# Altium footprint library LimeMicroAltiumLib_pcbLib_r01.PcbLib: 434 footprints (part 12 of 29)
Each footprint in its own frame and in the unit in brackets; x right, y up, seen from the top. Pads: shape width x height; smd on the part's side, far side on the other; paste and mask are expansions set on the pad; w line width, h text height; cw(c..) or ccw(c..) is an arc to the next point about the centre after c.
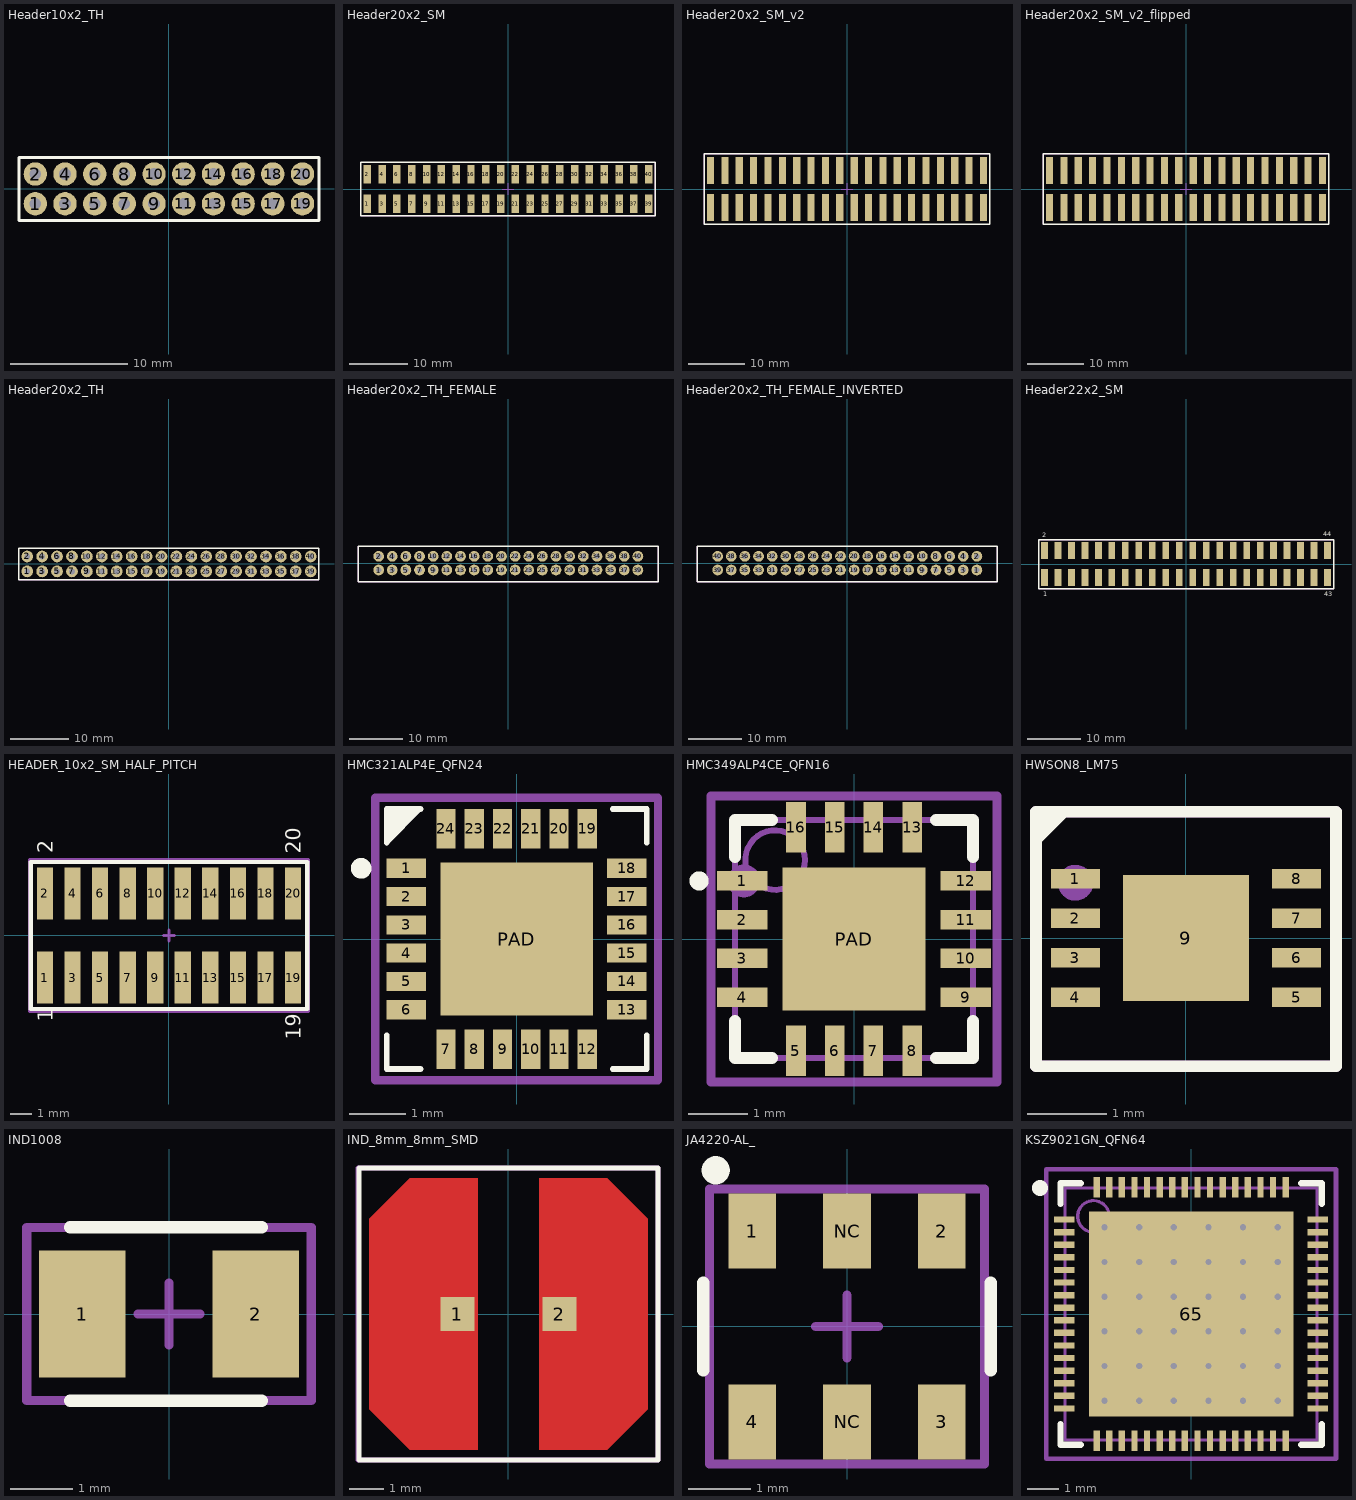
[diagram p11: the footprints below, top view; thin cyan lines are the x and y axes]

## Header10x2_TH [mm] "JTAG"
pads (20):
  round 2 hole 1: 1(-11.443,-1.271) 2(-11.443,1.271) 3(-8.9,-1.271) 4(-8.9,1.271) 5(-6.357,-1.271) 6(-6.357,1.271) 7(-3.814,-1.271) 8(-3.814,1.271) 9(-1.271,-1.271) 10(-1.271,1.271) 11(1.271,-1.271) 12(1.271,1.271) 13(3.814,-1.271) 14(3.814,1.271) 15(6.357,-1.271) 16(6.357,1.271) 17(8.9,-1.271) 18(8.9,1.271) 19(11.443,-1.271) 20(11.443,1.271)
Top Overlay:
  lines w0.254: -12.843,-2.7 12.857,-2.7 12.857,2.675 -12.843,2.675 -12.843,-2.7
Mechanical 15:
  lines w0.15: -12.843,-2.7 -12.843,2.675 12.857,2.675 12.857,-2.7 -12.843,-2.7
  text ".Designator" at -0.543,-0.021 h0.55
3D body "65775.stp": height 8.54, standoff -3, extent -12.713,0.002 -10.173,2.542
3D body "65775.stp": height 8.54, standoff -3, extent -12.713,-2.541 -10.173,-0.001
3D body "65775.stp": height 8.54, standoff -3, extent -10.17,-2.541 -7.63,-0.001
3D body "65775.stp": height 8.54, standoff -3, extent -10.17,0.002 -7.63,2.542
3D body "65775.stp": height 8.54, standoff -3, extent -7.627,-2.541 -5.087,-0.001
3D body "65775.stp": height 8.54, standoff -3, extent -7.627,0.002 -5.087,2.542
3D body "65775.stp": height 8.54, standoff -3, extent 0.001,0.002 2.541,2.542
3D body "65775.stp": height 8.54, standoff -3, extent 0.001,-2.541 2.541,-0.001
3D body "65775.stp": height 8.54, standoff -3, extent -2.541,0.002 -0.001,2.542
3D body "65775.stp": height 8.54, standoff -3, extent -2.541,-2.541 -0.001,-0.001
3D body "65775.stp": height 8.54, standoff -3, extent -5.084,-2.541 -2.544,-0.001
3D body "65775.stp": height 8.54, standoff -3, extent -5.084,0.002 -2.544,2.542
3D body "65775.stp": height 8.54, standoff -3, extent 7.63,0.002 10.17,2.542
3D body "65775.stp": height 8.54, standoff -3, extent 7.63,-2.541 10.17,-0.001
3D body "65775.stp": height 8.54, standoff -3, extent 5.087,0.002 7.627,2.542
3D body "65775.stp": height 8.54, standoff -3, extent 5.087,-2.541 7.627,-0.001
3D body "65775.stp": height 8.54, standoff -3, extent 2.544,-2.541 5.084,-0.001
3D body "65775.stp": height 8.54, standoff -3, extent 2.544,0.002 5.084,2.542
3D body "65775.stp": height 8.54, standoff -3, extent 10.173,-2.541 12.713,-0.001
3D body "65775.stp": height 8.54, standoff -3, extent 10.173,0.002 12.713,2.542

## Header20x2_SM [mm]
pads (40):
  rect 1.27x3.2 smd: 1(-24.157,-2.55) 2(-24.157,2.55) 3(-21.614,-2.55) 4(-21.614,2.55) 5(-19.071,-2.55) 6(-19.071,2.55) 7(-16.529,-2.55) 8(-16.529,2.55) 9(-13.986,-2.55) 10(-13.986,2.55) 11(-11.443,-2.55) 12(-11.443,2.55) 13(-8.9,-2.55) 14(-8.9,2.55) 15(-6.357,-2.55) 16(-6.357,2.55) 17(-3.814,-2.55) 18(-3.814,2.55) 19(-1.271,-2.55) 20(-1.271,2.55) 21(1.271,-2.55) 22(1.271,2.55) 23(3.814,-2.55) 24(3.814,2.55) 25(6.357,-2.55) 26(6.357,2.55) 27(8.9,-2.55) 28(8.9,2.55) 29(11.443,-2.55) 30(11.443,2.55) 31(13.986,-2.55) 32(13.986,2.55) 33(16.529,-2.55) 34(16.529,2.55) 35(19.071,-2.55) 36(19.071,2.55) 37(21.614,-2.55) 38(21.614,2.55) 39(24.157,-2.55) 40(24.157,2.55)
Top Overlay:
  lines w0.254: -25.257,-4.6 25.257,-4.6 25.257,4.6 -25.257,4.6 -25.257,-4.6
Mechanical 15:
  lines w0.1: -1,0 0,0 ; 0,-1 0,0 ; 0,1 0,0 ; 1,0 0,0
  lines w0.15: -25.257,-4.6 -25.257,4.6 25.257,4.6 25.257,-4.6 -25.257,-4.6
  text ".Designator" at 0,0 h0.55
3D body "pin_header_a-sl254-dg-g08mp1.stp": height 9.7, standoff -0.04, extent -25.437,-3.95 -15.277,3.55
3D body "pin_header_a-sl254-dg-g08mp1.stp": height 9.7, standoff -0.04, extent -15.277,-3.95 -5.117,3.55
3D body "pin_header_a-sl254-dg-g08mp1.stp": height 9.7, standoff -0.04, extent -5.106,-3.95 5.054,3.55
3D body "pin_header_a-sl254-dg-g08mp1.stp": height 9.7, standoff -0.04, extent 5.066,-3.95 15.226,3.55
3D body "pin_header_a-sl254-dg-g08mp1.stp": height 9.7, standoff -0.04, extent 15.237,-3.95 25.397,3.55

## Header20x2_SM_v2 [mm]
pads (40):
  rect 1.27x4.8 smd: 1(-24.157,-3.25) 2(-24.157,3.25) 3(-21.614,-3.25) 4(-21.614,3.25) 5(-19.071,-3.25) 6(-19.071,3.25) 7(-16.529,-3.25) 8(-16.529,3.25) 9(-13.986,-3.25) 10(-13.986,3.25) 11(-11.443,-3.25) 12(-11.443,3.25) 13(-8.9,-3.25) 14(-8.9,3.25) 15(-6.357,-3.25) 16(-6.357,3.25) 17(-3.814,-3.25) 18(-3.814,3.25) 19(-1.271,-3.25) 20(-1.271,3.25) 21(1.271,-3.25) 22(1.271,3.25) 23(3.814,-3.25) 24(3.814,3.25) 25(6.357,-3.25) 26(6.357,3.25) 27(8.9,-3.25) 28(8.9,3.25) 29(11.443,-3.25) 30(11.443,3.25) 31(13.986,-3.25) 32(13.986,3.25) 33(16.529,-3.25) 34(16.529,3.25) 35(19.071,-3.25) 36(19.071,3.25) 37(21.614,-3.25) 38(21.614,3.25) 39(24.157,-3.25) 40(24.157,3.25)
Top Overlay:
  lines w0.254: -25.257,-6.25 25.257,-6.25 25.257,6.25 -25.257,6.25 -25.257,-6.25
Mechanical 15:
  lines w0.1: -1,0 0,0 ; 0,-1 0,0 ; 0,1 0,0 ; 1,0 0,0
  lines w0.15: -25.257,-6.25 -25.257,6.25 25.257,6.25 25.257,-6.25 -25.257,-6.25
  text ".Designator" at 0,0 h0.55
3D body "pin_header_a-sl254-dg-g08mp1.stp": height 9.7, standoff -0.04, extent -25.437,-3.95 -15.277,3.55
3D body "pin_header_a-sl254-dg-g08mp1.stp": height 9.7, standoff -0.04, extent -15.277,-3.95 -5.117,3.55
3D body "pin_header_a-sl254-dg-g08mp1.stp": height 9.7, standoff -0.04, extent -5.106,-3.95 5.054,3.55
3D body "pin_header_a-sl254-dg-g08mp1.stp": height 9.7, standoff -0.04, extent 5.066,-3.95 15.226,3.55
3D body "pin_header_a-sl254-dg-g08mp1.stp": height 9.7, standoff -0.04, extent 15.237,-3.95 25.397,3.55

## Header20x2_SM_v2_flipped [mm]
pads (40):
  rect 1.27x4.8 smd: 1(24.157,3.25) 2(24.157,-3.25) 3(21.614,3.25) 4(21.614,-3.25) 5(19.071,3.25) 6(19.071,-3.25) 7(16.529,3.25) 8(16.529,-3.25) 9(13.986,3.25) 10(13.986,-3.25) 11(11.443,3.25) 12(11.443,-3.25) 13(8.9,3.25) 14(8.9,-3.25) 15(6.357,3.25) 16(6.357,-3.25) 17(3.814,3.25) 18(3.814,-3.25) 19(1.271,3.25) 20(1.271,-3.25) 21(-1.271,3.25) 22(-1.271,-3.25) 23(-3.814,3.25) 24(-3.814,-3.25) 25(-6.357,3.25) 26(-6.357,-3.25) 27(-8.9,3.25) 28(-8.9,-3.25) 29(-11.443,3.25) 30(-11.443,-3.25) 31(-13.986,3.25) 32(-13.986,-3.25) 33(-16.529,3.25) 34(-16.529,-3.25) 35(-19.071,3.25) 36(-19.071,-3.25) 37(-21.614,3.25) 38(-21.614,-3.25) 39(-24.157,3.25) 40(-24.157,-3.25)
Top Overlay:
  lines w0.254: -25.257,-6.25 25.257,-6.25 25.257,6.25 -25.257,6.25 -25.257,-6.25
Mechanical 15:
  lines w0.1: -1,0 0,0 ; 0,-1 0,0 ; 0,1 0,0 ; 1,0 0,0
  lines w0.15: -25.257,-6.25 -25.257,6.25 25.257,6.25 25.257,-6.25 -25.257,-6.25
  text ".Designator" at 0,0 h0.55
3D body "User Library-Molex - 15-91-0100 (Pin Header 2_54mm 10 Pin).step": height 9.66, standoff 0, extent 12.679,-3.5 25.379,3.5
3D body "User Library-Molex - 15-91-0100 (Pin Header 2_54mm 10 Pin).step": height 9.66, standoff 0, extent -0.021,-3.5 12.679,3.5
3D body "User Library-Molex - 15-91-0100 (Pin Header 2_54mm 10 Pin).step": height 9.66, standoff 0, extent -12.721,-3.5 -0.021,3.5
3D body "User Library-Molex - 15-91-0100 (Pin Header 2_54mm 10 Pin).step": height 9.66, standoff 0, extent -25.421,-3.5 -12.721,3.5

## Header20x2_TH [mm] "JTAG"
pads (40):
  round 2 hole 1: 1(-24.157,-1.271) 2(-24.157,1.271) 3(-21.614,-1.271) 4(-21.614,1.271) 5(-19.071,-1.271) 6(-19.071,1.271) 7(-16.529,-1.271) 8(-16.529,1.271) 9(-13.986,-1.271) 10(-13.986,1.271) 11(-11.443,-1.271) 12(-11.443,1.271) 13(-8.9,-1.271) 14(-8.9,1.271) 15(-6.357,-1.271) 16(-6.357,1.271) 17(-3.814,-1.271) 18(-3.814,1.271) 19(-1.271,-1.271) 20(-1.271,1.271) 21(1.271,-1.271) 22(1.271,1.271) 23(3.814,-1.271) 24(3.814,1.271) 25(6.357,-1.271) 26(6.357,1.271) 27(8.9,-1.271) 28(8.9,1.271) 29(11.443,-1.271) 30(11.443,1.271) 31(13.986,-1.271) 32(13.986,1.271) 33(16.529,-1.271) 34(16.529,1.271) 35(19.071,-1.271) 36(19.071,1.271) 37(21.614,-1.271) 38(21.614,1.271) 39(24.157,-1.271) 40(24.157,1.271)
Top Overlay:
  lines w0.254: -25.557,-2.7 -25.557,2.675 25.571,2.675 25.571,-2.7 -25.557,-2.7
Mechanical 15:
  lines w0.15: -25.557,-2.7 25.571,-2.7 25.571,2.675 -25.557,2.675 -25.557,-2.7
  text ".Designator" at 0,0 h0.55
3D body "65775.stp": height 8.54, standoff -3, extent 12.716,0.002 15.256,2.542
3D body "65775.stp": height 8.54, standoff -3, extent 12.716,-2.541 15.256,-0.001
3D body "65775.stp": height 8.54, standoff -3, extent 20.344,0.002 22.884,2.542
3D body "65775.stp": height 8.54, standoff -3, extent 20.344,-2.541 22.884,-0.001
3D body "65775.stp": height 8.54, standoff -3, extent 17.802,0.002 20.342,2.542
3D body "65775.stp": height 8.54, standoff -3, extent 17.802,-2.541 20.342,-0.001
3D body "65775.stp": height 8.54, standoff -3, extent 15.259,-2.541 17.799,-0.001
3D body "65775.stp": height 8.54, standoff -3, extent 15.259,0.002 17.799,2.542
3D body "65775.stp": height 8.54, standoff -3, extent 22.887,-2.541 25.427,-0.001
3D body "65775.stp": height 8.54, standoff -3, extent 22.887,0.002 25.427,2.542
3D body "65775.stp": height 8.54, standoff -3, extent 0.002,0.002 2.542,2.542
3D body "65775.stp": height 8.54, standoff -3, extent 0.002,-2.541 2.542,-0.001
3D body "65775.stp": height 8.54, standoff -3, extent 7.63,0.002 10.17,2.542
3D body "65775.stp": height 8.54, standoff -3, extent 7.63,-2.541 10.17,-0.001
3D body "65775.stp": height 8.54, standoff -3, extent 5.087,0.002 7.627,2.542
3D body "65775.stp": height 8.54, standoff -3, extent 5.087,-2.541 7.627,-0.001
3D body "65775.stp": height 8.54, standoff -3, extent 2.544,-2.541 5.084,-0.001
3D body "65775.stp": height 8.54, standoff -3, extent 2.544,0.002 5.084,2.542
3D body "65775.stp": height 8.54, standoff -3, extent 10.173,-2.541 12.713,-0.001
3D body "65775.stp": height 8.54, standoff -3, extent 10.173,0.002 12.713,2.542
3D body "65775.stp": height 8.54, standoff -3, extent -2.541,0.002 -0.001,2.542
3D body "65775.stp": height 8.54, standoff -3, extent -2.541,-2.541 -0.001,-0.001
3D body "65775.stp": height 8.54, standoff -3, extent -10.17,0.002 -7.63,2.542
3D body "65775.stp": height 8.54, standoff -3, extent -10.17,-2.541 -7.63,-0.001
3D body "65775.stp": height 8.54, standoff -3, extent -7.627,-2.541 -5.087,-0.001
3D body "65775.stp": height 8.54, standoff -3, extent -7.627,0.002 -5.087,2.542
3D body "65775.stp": height 8.54, standoff -3, extent -5.084,-2.541 -2.544,-0.001
3D body "65775.stp": height 8.54, standoff -3, extent -5.084,0.002 -2.544,2.542
3D body "65775.stp": height 8.54, standoff -3, extent -17.799,0.002 -15.259,2.542
3D body "65775.stp": height 8.54, standoff -3, extent -17.799,-2.541 -15.259,-0.001
3D body "65775.stp": height 8.54, standoff -3, extent -15.256,-2.541 -12.716,-0.001
3D body "65775.stp": height 8.54, standoff -3, extent -15.256,0.002 -12.716,2.542
3D body "65775.stp": height 8.54, standoff -3, extent -12.713,-2.541 -10.173,-0.001
3D body "65775.stp": height 8.54, standoff -3, extent -12.713,0.002 -10.173,2.542
3D body "65775.stp": height 8.54, standoff -3, extent -20.341,0.002 -17.801,2.542
3D body "65775.stp": height 8.54, standoff -3, extent -20.341,-2.541 -17.801,-0.001
3D body "65775.stp": height 8.54, standoff -3, extent -22.884,0.002 -20.344,2.542
3D body "65775.stp": height 8.54, standoff -3, extent -22.884,-2.541 -20.344,-0.001
3D body "65775.stp": height 8.54, standoff -3, extent -25.427,-2.541 -22.887,-0.001
3D body "65775.stp": height 8.54, standoff -3, extent -25.427,0.002 -22.887,2.542

## Header20x2_TH_FEMALE [mm] "JTAG"
pads (40):
  round 2 hole 1: 1(-24.157,-1.271) 2(-24.157,1.271) 3(-21.614,-1.271) 4(-21.614,1.271) 5(-19.071,-1.271) 6(-19.071,1.271) 7(-16.529,-1.271) 8(-16.529,1.271) 9(-13.986,-1.271) 10(-13.986,1.271) 11(-11.443,-1.271) 12(-11.443,1.271) 13(-8.9,-1.271) 14(-8.9,1.271) 15(-6.357,-1.271) 16(-6.357,1.271) 17(-3.814,-1.271) 18(-3.814,1.271) 19(-1.271,-1.271) 20(-1.271,1.271) 21(1.271,-1.271) 22(1.271,1.271) 23(3.814,-1.271) 24(3.814,1.271) 25(6.357,-1.271) 26(6.357,1.271) 27(8.9,-1.271) 28(8.9,1.271) 29(11.443,-1.271) 30(11.443,1.271) 31(13.986,-1.271) 32(13.986,1.271) 33(16.529,-1.271) 34(16.529,1.271) 35(19.071,-1.271) 36(19.071,1.271) 37(21.614,-1.271) 38(21.614,1.271) 39(24.157,-1.271) 40(24.157,1.271)
Top Overlay:
  lines w0.254: -28,-3.5 -28,3.2 27.9,3.2 27.9,-3.5 -28,-3.5
Mechanical 15:
  lines w0.15: -28,-3.5 27.9,-3.5 27.9,3.2 -28,3.2 -28,-3.5
  text ".Designator" at 0,0 h0.55
3D body "SFH11-xxPC-D20-ST-BK.STEP": height 8.54, standoff -3.16, extent -27.83,-4.1 27.89,3

## Header20x2_TH_FEMALE_INVERTED [mm] "JTAG"
pads (40):
  round 2 hole 1: 1(24.157,-1.271) 2(24.157,1.271) 3(21.614,-1.271) 4(21.614,1.271) 5(19.071,-1.271) 6(19.071,1.271) 7(16.529,-1.271) 8(16.529,1.271) 9(13.986,-1.271) 10(13.986,1.271) 11(11.443,-1.271) 12(11.443,1.271) 13(8.9,-1.271) 14(8.9,1.271) 15(6.357,-1.271) 16(6.357,1.271) 17(3.814,-1.271) 18(3.814,1.271) 19(1.271,-1.271) 20(1.271,1.271) 21(-1.271,-1.271) 22(-1.271,1.271) 23(-3.814,-1.271) 24(-3.814,1.271) 25(-6.357,-1.271) 26(-6.357,1.271) 27(-8.9,-1.271) 28(-8.9,1.271) 29(-11.443,-1.271) 30(-11.443,1.271) 31(-13.986,-1.271) 32(-13.986,1.271) 33(-16.529,-1.271) 34(-16.529,1.271) 35(-19.071,-1.271) 36(-19.071,1.271) 37(-21.614,-1.271) 38(-21.614,1.271) 39(-24.157,-1.271) 40(-24.157,1.271)
Top Overlay:
  lines w0.254: -28,-3.5 -28,3.2 27.9,3.2 27.9,-3.5 -28,-3.5
Mechanical 15:
  lines w0.15: -28,-3.5 27.9,-3.5 27.9,3.2 -28,3.2 -28,-3.5
  text ".Designator" at 0,0 h0.55
3D body "SFH11-xxPC-D20-ST-BK.STEP": height 8.54, standoff -3.16, extent -27.83,-4.1 27.89,3

## Header22x2_SM [mm]
pads (44):
  rect 1.27x3.2 smd: 1(-26.7,-2.55) 2(-26.7,2.55) 3(-24.157,-2.55) 4(-24.157,2.55) 5(-21.614,-2.55) 6(-21.614,2.55) 7(-19.071,-2.55) 8(-19.071,2.55) 9(-16.529,-2.55) 10(-16.529,2.55) 11(-13.986,-2.55) 12(-13.986,2.55) 13(-11.443,-2.55) 14(-11.443,2.55) 15(-8.9,-2.55) 16(-8.9,2.55) 17(-6.357,-2.55) 18(-6.357,2.55) 19(-3.814,-2.55) 20(-3.814,2.55) 21(-1.271,-2.55) 22(-1.271,2.55) 23(1.271,-2.55) 24(1.271,2.55) 25(3.814,-2.55) 26(3.814,2.55) 27(6.357,-2.55) 28(6.357,2.55) 29(8.9,-2.55) 30(8.9,2.55) 31(11.443,-2.55) 32(11.443,2.55) 33(13.986,-2.55) 34(13.986,2.55) 35(16.529,-2.55) 36(16.529,2.55) 37(19.071,-2.55) 38(19.071,2.55) 39(21.614,-2.55) 40(21.614,2.55) 41(24.157,-2.55) 42(24.157,2.55) 43(26.7,-2.55) 44(26.7,2.55)
Top Overlay:
  lines w0.254: -27.8,-4.6 27.854,-4.6 27.854,4.6 -27.8,4.6 -27.8,-4.6
  text "1" at -26.9,-6.075 h0.9
  text "2" at -27.1,5.125 h0.9
  text "44" at 25.875,5.25 h0.9
  text "43" at 26.125,-6.05 h0.9
Mechanical 15:
  lines w0.15: -27.8,-4.6 -27.8,4.6 27.854,4.6 27.854,-4.6 -27.8,-4.6
  text ".Designator" at -1.296,0.075 h0.55
3D body "pin_header_a-sl254-dg-g20mp1.stp": height 9.7, standoff -0.04, extent -27.9,-3.75 -2.5,3.75
3D body "pin_header_a-sl254-dg-g20mp1.stp": height 9.7, standoff -0.04, extent -2.5,-3.75 22.9,3.75
3D body "pin_header_a-sl254-dg-g20mp1.stp": height 9.7, standoff -0.04, extent 2.586,-3.75 27.986,3.75

## HEADER_10x2_SM_HALF_PITCH [mm]
pads (20):
  rect 0.75x2.4 smd: 1(-5.737,-1.95) 2(-5.737,1.95) 3(-4.462,-1.95) 4(-4.462,1.95) 5(-3.187,-1.95) 6(-3.187,1.95) 7(-1.912,-1.95) 8(-1.913,1.95) 9(-0.637,-1.95) 10(-0.638,1.95) 11(0.638,-1.95) 12(0.637,1.95) 13(1.913,-1.95) 14(1.912,1.95) 15(3.188,-1.95) 16(3.187,1.95) 17(4.463,-1.95) 18(4.462,1.95) 19(5.737,-1.95) 20(5.737,1.95)
Top Overlay:
  lines w0.2: -6.387,-3.4 -6.387,3.4 6.388,3.4 6.388,-3.4 -6.387,-3.4
  text "1" at -5.387,-4 h0.7
  text "19" at 6.087,-4.825 h0.7
  text "2" at -5.387,3.8 h0.7
  text "20" at 6.087,3.775 h0.7
Mechanical 15:
  lines w0.15: -0.25,0 0.25,0 ; 0,-0.25 0,0.25 ; -6.437,-3.5 -6.437,3.5 6.438,3.5 6.438,-3.5 -6.437,-3.5
  text ".designator" at 0,0 h0.55
3D body "pin_header_a-sl127-dg-g02mp1.stp": height 6.37, standoff -0.03, extent 5.093,-2.752 6.362,2.752
3D body "pin_header_a-sl127-dg-g02mp1.stp": height 6.37, standoff -0.03, extent 3.818,-2.752 5.087,2.752
3D body "pin_header_a-sl127-dg-g02mp1.stp": height 6.37, standoff -0.03, extent 2.543,-2.752 3.812,2.752
3D body "pin_header_a-sl127-dg-g02mp1.stp": height 6.37, standoff -0.03, extent 1.268,-2.752 2.537,2.752
3D body "pin_header_a-sl127-dg-g02mp1.stp": height 6.37, standoff -0.03, extent -0.007,-2.752 1.262,2.752
3D body "pin_header_a-sl127-dg-g02mp1.stp": height 6.37, standoff -0.03, extent -6.362,-2.752 -5.092,2.752
3D body "pin_header_a-sl127-dg-g02mp1.stp": height 6.37, standoff -0.03, extent -5.092,-2.752 -3.822,2.752
3D body "pin_header_a-sl127-dg-g02mp1.stp": height 6.37, standoff -0.03, extent -3.822,-2.752 -2.552,2.752
3D body "pin_header_a-sl127-dg-g02mp1.stp": height 6.37, standoff -0.03, extent -2.552,-2.752 -1.282,2.752
3D body "pin_header_a-sl127-dg-g02mp1.stp": height 6.37, standoff -0.03, extent -1.282,-2.752 -0.013,2.752

## HMC321ALP4E_QFN24 [mm]
pads (25):
  rect 0.7x0.34 smd mask+0.05: 1(-1.95,1.25) 2(-1.95,0.75) 3(-1.95,0.25) 4(-1.95,-0.25) 5(-1.95,-0.75) 6(-1.95,-1.25) 13(1.95,-1.25) 14(1.95,-0.75) 15(1.95,-0.25) 16(1.95,0.25) 17(1.95,0.75) 18(1.95,1.25)
  rect 0.34x0.7 smd mask+0.05: 7(-1.25,-1.95) 8(-0.75,-1.95) 9(-0.25,-1.95) 10(0.25,-1.95) 11(0.75,-1.95) 12(1.25,-1.95) 19(1.25,1.95) 20(0.75,1.95) 21(0.25,1.95) 22(-0.25,1.95) 23(-0.75,1.95) 24(-1.25,1.95)
  rect 2.7x2.7 smd mask+0.05: PAD(0,0)
Top Overlay:
  circle w0.25: c-2.75,1.25 r0.056
  region: -2.3,2.3 -1.65,2.3 -2.3,1.65
  lines w0.1: -2.3,-1.7 -2.3,-2.3 -1.7,-2.3 ; -2.3,1.7 -2.3,2.3 -1.7,2.3 ; 1.7,-2.3 2.3,-2.3 2.3,-1.7 ; 1.7,2.3 2.3,2.3 2.3,1.7
Mechanical 15:
  circle w0.1: c-1.975,1.25 r0.05
  lines w0.15: -0.2,0 0.2,0 ; 0,-0.2 0,0.2 ; -2.5,-2.5 -2.5,2.5 2.5,2.5 2.5,-2.5 -2.5,-2.5
  text ".Designator" at 0,0 h0.55
3D body "User Library-QFN 24 4x4.step": height 0.9, standoff 0, extent -2.002,-2.002 2.002,2.002

## HMC349ALP4CE_QFN16 [mm]
pads (17):
  rect 0.85x0.33 smd mask+0.05: 1(-1.875,0.975) 2(-1.875,0.325) 3(-1.875,-0.325) 4(-1.875,-0.975) 9(1.875,-0.975) 10(1.875,-0.325) 11(1.875,0.325) 12(1.875,0.975)
  rect 0.33x0.85 smd mask+0.05: 5(-0.975,-1.875) 6(-0.325,-1.875) 7(0.325,-1.875) 8(0.975,-1.875) 13(0.975,1.875) 14(0.325,1.875) 15(-0.325,1.875) 16(-0.975,1.875)
  rect 2.4x2.4 smd mask+0.05: PAD(0,0)
Top Overlay:
  circle w0.25: c-2.6,0.975 r0.035
  lines w0.2: -2,-1.375 -2,-2 -1.375,-2 ; -2,1.375 -2,2 -1.375,2 ; 1.375,-2 2,-2 2,-1.375 ; 1.375,2 2,2 2,1.375
Mechanical 13:
  circle w0.1: c-1.325,1.325 r0.5
  lines w0.1: -2,-2 -2,2 2,2 2,-2 -2,-2
Mechanical 15:
  circle w0.35: c-1.85,0.975 r0.1
  lines w0.15: -0.525,0.025 0.475,0.025 ; -0.025,-0.475 -0.025,0.525 ; -2.4,-2.4 -2.4,2.4 2.4,2.4 2.4,-2.4 -2.4,-2.4
  text ".Designator" at 0,0 h0.55
3D body "User Library-qfn16-4x4.step": height 0.92, standoff 0, extent -2,-2 2,2

## HWSON8_LM75 [mm]
pads (9):
  rect 0.625x0.25 smd mask+0.05: 1(-1.4,0.75) 2(-1.4,0.25) 3(-1.4,-0.25) 4(-1.4,-0.75) 5(1.4,-0.75) 6(1.4,-0.25) 7(1.4,0.25) 8(1.4,0.75)
  rect 1.6x1.6 smd mask+0.05: 9(0,0)
Top Overlay:
  region: -1.9,1.25 -1.9,1.6 -1.55,1.6
  lines w0.15: -1.9,1.25 -1.55,1.6 ; -1.9,-1.625 1.9,-1.625 1.9,1.6 -1.9,1.6 -1.9,-1.625
Mechanical 15:
  circle w0.254: c-1.4,0.7 r0.1
  lines w0.15: -0.3,0 0.3,0 ; 0,-0.3 0,0.3 ; -1.9,-1.625 1.9,-1.625 1.9,1.6 -1.9,1.6 -1.9,-1.625
  text ".Designator" at 0,0 h0.55
3D body "User Library-DFN-8.step": height 0.8, standoff 0, extent -1.51,-1.5 1.51,1.5

## IND1008 [mm] "1008 package inductor"
pads (2):
  rect 1.4x2.05 smd mask+0.05: 1(-1.4,0) 2(1.4,0)
Top Overlay:
  lines w0.2: -1.6,-1.4 1.5,-1.4 ; -1.6,1.4 1.5,1.4
Mechanical 15:
  lines w0.15: -0.5,0 0.5,0 ; 0,-0.5 0,0.5 ; -2.3,-1.4 2.3,-1.4 2.3,1.4 -2.3,1.4 -2.3,-1.4
  text ".Designator" at 0,0 h0.55
3D body "User Library-INDM2520X190N.step": height 1.8, standoff 0, extent -1.25,-1 1.25,1

## IND_8mm_8mm_SMD [mm]
pads (2):
  rect 1x1 smd: 1(-1.5,0) 2(1.5,0)
Top Layer:
  region: -0.9,4 -0.9,-4 -2.9,-4 -4.1,-2.8 -4.1,2.8 -2.9,4
  region: 0.9,4 0.9,-4 2.9,-4 4.1,-2.8 4.1,2.8 2.9,4
Top Overlay:
  lines w0.15: -4.4,-4.3 -4.4,4.3 4.4,4.3 4.4,-4.3 -4.4,-4.3
Top Paste:
  region: 0.9,-4 0.9,4 2.9,4 4.1,2.8 4.1,-2.8 2.9,-4
  region: -0.9,-4 -0.9,4 -2.9,4 -4.1,2.8 -4.1,-2.8 -2.9,-4
Mechanical 15:
  lines w0.15: -4.425,-4.3 4.4,-4.3 4.4,4.3 -4.425,4.3 -4.425,-4.3
  text "No polarity" at -3.5,-3.1 h0.55
  text ".Designator" at 0,0 h0.55
3D body "52617.stp": height 2.18, standoff -0.1, extent -3.538,-3.37 3.538,3.3

## JA4220-AL_ [mm]
pads (6):
  rect 0.76x1.2 smd mask+0.05: 1(-1.52,1.525) 2(1.52,1.525) 3(1.52,-1.525) 4(-1.52,-1.525) NC(0,-1.525) NC(0,1.525)
Top Overlay:
  circle w0.25: c-2.1,2.5 r0.1
  lines w0.2: -2.3,-0.7 -2.3,0.7 ; 2.3,-0.7 2.3,0.7
Mechanical 15:
  circle w0.25: c-1.5,1.6 r0.1
  lines w0.15: -0.5,0 0.5,0 ; 0,-0.5 0,0.5 ; -2.2,-2.2 2.2,-2.2 2.2,2.2 -2.2,2.2 -2.2,-2.2
  text ".Designator" at 0,0 h0.55
3D body "Coilcraft-JA4220-AL.step": height 3.03, standoff -0.02, extent -2.225,-2.095 2.225,2.095

## KSZ9021GN_QFN64 [mm] "QFN, 64-Leads, Body 8,00x8,00mm, Pitch 0,40mm, Thermal Pad 6,50x6,50mm, IPC Medium Density"
height 0.85
pads (65):
  rect 0.65x0.2 smd mask+0.05: 1(-4.025,3) 2(-4.025,2.6) 3(-4.025,2.2) 4(-4.025,1.8) 5(-4.025,1.4) 6(-4.025,1) 7(-4.025,0.6) 8(-4.025,0.2) 9(-4.025,-0.2) 10(-4.025,-0.6) 11(-4.025,-1) 12(-4.025,-1.4) 13(-4.025,-1.8) 14(-4.025,-2.2) 15(-4.025,-2.6) 16(-4.025,-3) 33(4.025,-3) 34(4.025,-2.6) 35(4.025,-2.2) 36(4.025,-1.8) 37(4.025,-1.4) 38(4.025,-1) 39(4.025,-0.6) 40(4.025,-0.2) 41(4.025,0.2) 42(4.025,0.6) 43(4.025,1) 44(4.025,1.4) 45(4.025,1.8) 46(4.025,2.2) 47(4.025,2.6) 48(4.025,3)
  rect 0.2x0.65 smd mask+0.05: 17(-3,-4.025) 18(-2.6,-4.025) 19(-2.2,-4.025) 20(-1.8,-4.025) 21(-1.4,-4.025) 22(-1,-4.025) 23(-0.6,-4.025) 24(-0.2,-4.025) 25(0.2,-4.025) 26(0.6,-4.025) 27(1,-4.025) 28(1.4,-4.025) 29(1.8,-4.025) 30(2.2,-4.025) 31(2.6,-4.025) 32(3,-4.025) 49(3,4.025) 50(2.6,4.025) 51(2.2,4.025) 52(1.8,4.025) 53(1.4,4.025) 54(1,4.025) 55(0.6,4.025) 56(0.2,4.025) 57(-0.2,4.025) 58(-0.6,4.025) 59(-1,4.025) 60(-1.4,4.025) 61(-1.8,4.025) 62(-2.2,4.025) 63(-2.6,4.025) 64(-3,4.025)
  rect 6.5x6.5 smd mask+0.05: 65(0,0)
via 2.75,-2.75 diameter 0.5 hole 0.2
via 1.65,-2.75 diameter 0.5 hole 0.2
via 0.55,-2.75 diameter 0.5 hole 0.2
via -0.55,-2.75 diameter 0.5 hole 0.2
via -1.65,-2.75 diameter 0.5 hole 0.2
via -2.75,-2.75 diameter 0.5 hole 0.2
via 2.75,-1.65 diameter 0.5 hole 0.2
via 1.65,-1.65 diameter 0.5 hole 0.2
via 0.55,-1.65 diameter 0.5 hole 0.2
via -0.55,-1.65 diameter 0.5 hole 0.2
via -1.65,-1.65 diameter 0.5 hole 0.2
via -2.75,-1.65 diameter 0.5 hole 0.2
via 2.75,-0.55 diameter 0.5 hole 0.2
via 1.65,-0.55 diameter 0.5 hole 0.2
via 0.55,-0.55 diameter 0.5 hole 0.2
via -0.55,-0.55 diameter 0.5 hole 0.2
via -1.65,-0.55 diameter 0.5 hole 0.2
via -2.75,-0.55 diameter 0.5 hole 0.2
via 2.75,0.55 diameter 0.5 hole 0.2
via 1.65,0.55 diameter 0.5 hole 0.2
via 0.55,0.55 diameter 0.5 hole 0.2
via -0.55,0.55 diameter 0.5 hole 0.2
via -1.65,0.55 diameter 0.5 hole 0.2
via -2.75,0.55 diameter 0.5 hole 0.2
via 2.75,1.65 diameter 0.5 hole 0.2
via 1.65,1.65 diameter 0.5 hole 0.2
via 0.55,1.65 diameter 0.5 hole 0.2
via -0.55,1.65 diameter 0.5 hole 0.2
via -1.65,1.65 diameter 0.5 hole 0.2
via -2.75,1.65 diameter 0.5 hole 0.2
via 2.75,2.75 diameter 0.5 hole 0.2
via 1.65,2.75 diameter 0.5 hole 0.2
via 0.55,2.75 diameter 0.5 hole 0.2
via -0.55,2.75 diameter 0.5 hole 0.2
via -1.65,2.75 diameter 0.5 hole 0.2
via -2.75,2.75 diameter 0.5 hole 0.2
Top Overlay:
  circle w0.25: c-4.8,4 r0.125
  lines w0.2: -4.15,-3.5 -4.15,-4.15 -3.5,-4.15 ; -4.15,3.5 -4.15,4.15 -3.5,4.15 ; 3.5,-4.15 4.15,-4.15 4.15,-3.5 ; 3.5,4.15 4.15,4.15 4.15,3.5
Mechanical 13:
  circle w0.1: c-3.1,3.1 r0.5
  lines w0.1: -4,-4 4,-4 4,4 -4,4 -4,-4
Mechanical 15:
  circle w0.1: c-4.025,3 r0.035
  lines w0.15: -0.5,0 0.5,0 ; 0,-0.5 0,0.5 ; -4.6,-4.6 4.6,-4.6 4.6,4.6 -4.6,4.6 -4.6,-4.6
  text ".Designator" at 0,0 h0.55
3D body: height 0.85, standoff 0.01, extent -4,-4 4,4